# Altium footprint library domino-wire-protector.PcbLib: 120 footprints (part 5 of 8)
Each footprint in its own frame and in the unit in brackets; x right, y up, seen from the top. Pads: shape width x height; smd on the part's side, far side on the other; paste and mask are expansions set on the pad; w line width, h text height; cw(c..) or ccw(c..) is an arc to the next point about the centre after c.
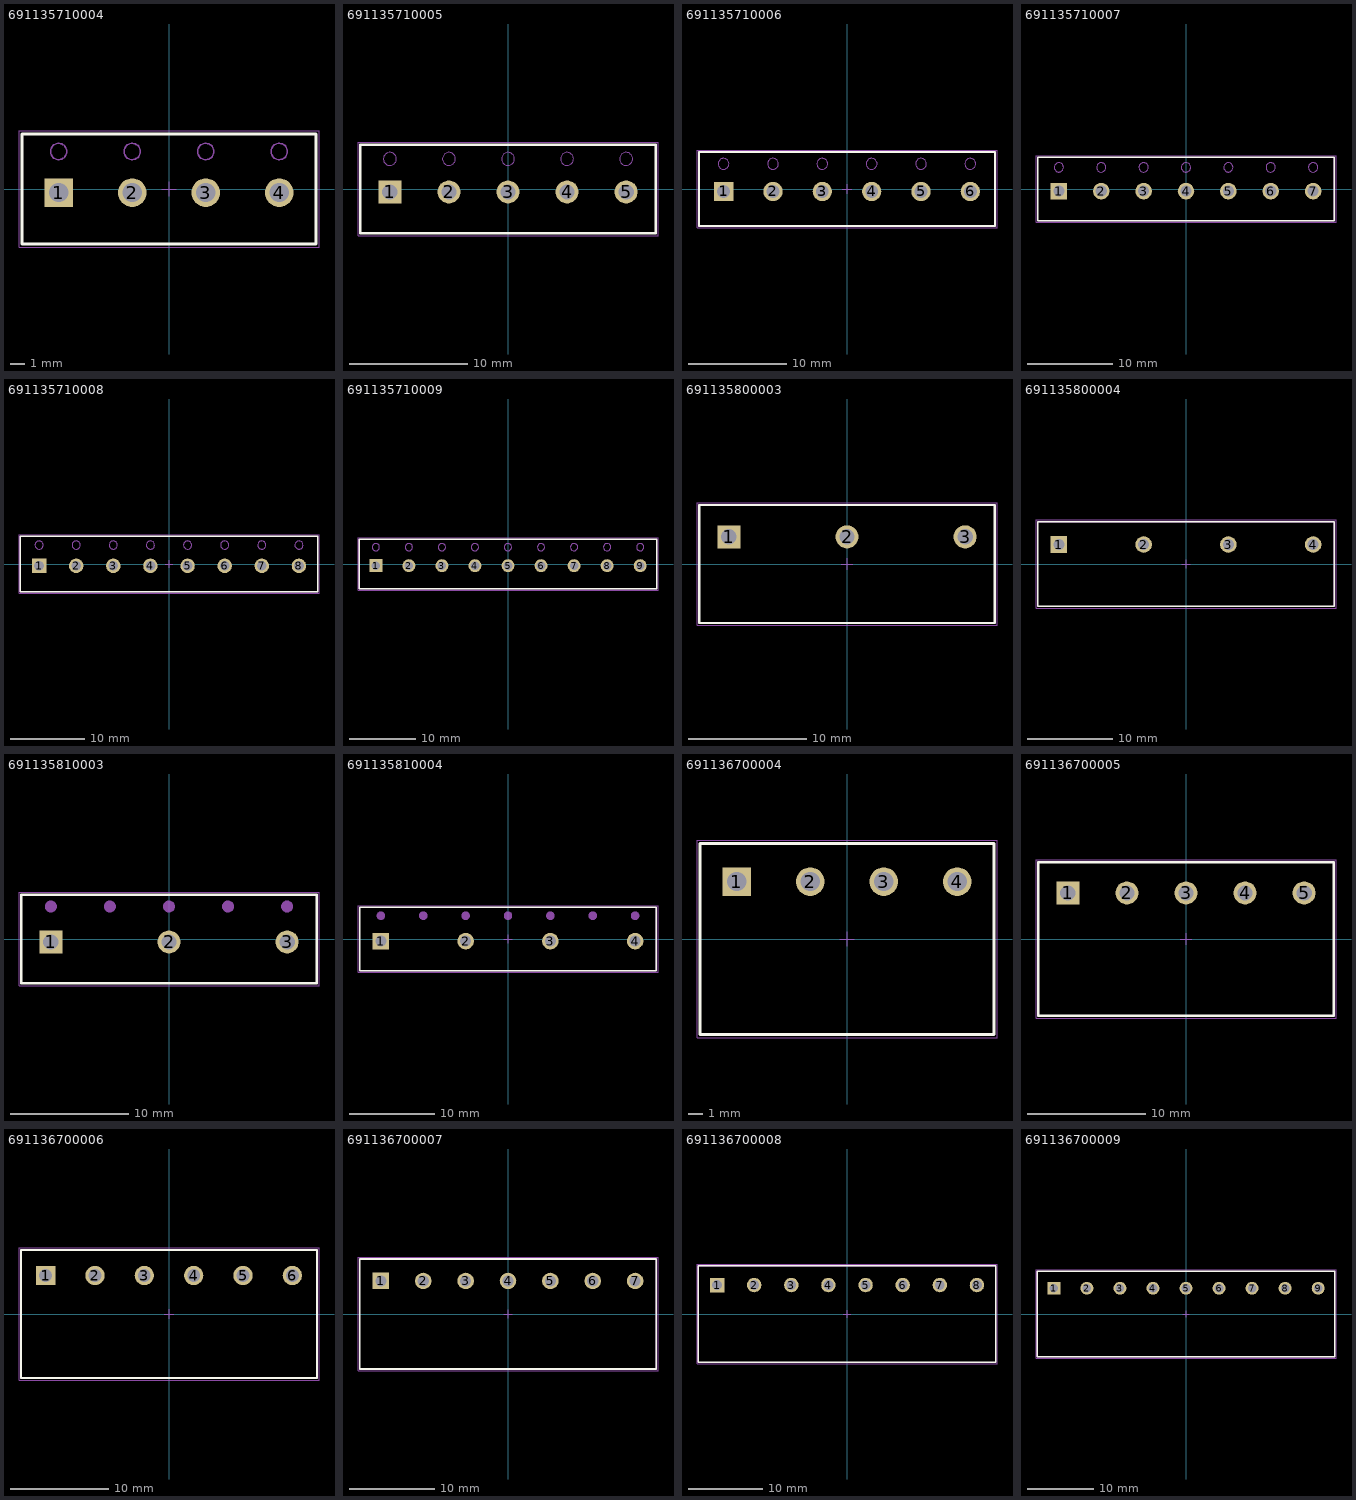
[diagram p4: the footprints below, top view; thin cyan lines are the x and y axes]

## 691135710004 [mm] "Serie 1357 - 5.00 mm_4 pins"
height 10
pads (4):
  rect 1.95x1.95 hole 1.3 paste+0: 1(-7.5,-0.25)
  round 1.95 hole 1.3 paste+0: 2(-2.5,-0.25) 3(2.5,-0.25) 4(7.5,-0.25)
Top Overlay:
  lines w0.2: -10,-3.75 10,-3.75 10,3.75 -10,3.75 -10,-3.75
Mechanical 13:
  circle w0.1: c-7.5,2.55 r0.55
  circle w0.1: c-2.5,2.55 r0.55
  circle w0.1: c2.5,2.55 r0.55
  circle w0.1: c7.5,2.55 r0.55
  lines w0.1: -10,-3.75 -10,3.75 10,3.75 10,-3.75 -10,-3.75
Mechanical 15:
  lines w0.05: -0.5,0 0.5,0 ; 0,-0.5 0,0.5 ; -10.2,-3.95 -10.2,3.95 10.2,3.95 10.2,-3.95 -10.2,-3.95
3D body "691135710004.stp": height 10.1, standoff -3.9, extent -10,-3.75 10,3.75

## 691135710005 [mm] "Serie 1357 - 5.00 mm_5 pins"
height 10
pads (5):
  rect 1.95x1.95 hole 1.3 paste+0: 1(-10,-0.25)
  round 1.95 hole 1.3 paste+0: 2(-5,-0.25) 3(0,-0.25) 4(5,-0.25) 5(10,-0.25)
Top Overlay:
  lines w0.2: -12.5,-3.75 12.5,-3.75 12.5,3.75 -12.5,3.75 -12.5,-3.75
Mechanical 13:
  circle w0.1: c-10,2.55 r0.55
  circle w0.1: c-5,2.55 r0.55
  circle w0.1: c0,2.55 r0.55
  circle w0.1: c5,2.55 r0.55
  circle w0.1: c10,2.55 r0.55
  lines w0.1: -12.5,-3.75 -12.5,3.75 12.5,3.75 12.5,-3.75 -12.5,-3.75
Mechanical 15:
  lines w0.05: -0.5,0 0.5,0 ; 0,-0.5 0,0.5 ; -12.7,-3.95 -12.7,3.95 12.7,3.95 12.7,-3.95 -12.7,-3.95
3D body "691135710005.stp": height 10.1, standoff -3.9, extent -12.5,-3.75 12.5,3.75

## 691135710006 [mm] "Serie 1357 - 5.00 mm_6 pins"
height 10
pads (6):
  rect 1.95x1.95 hole 1.3 paste+0: 1(-12.5,-0.25)
  round 1.95 hole 1.3 paste+0: 2(-7.5,-0.25) 3(-2.5,-0.25) 4(2.5,-0.25) 5(7.5,-0.25) 6(12.5,-0.25)
Top Overlay:
  lines w0.2: -15,-3.75 -15,3.75 15,3.75 15,-3.75 -15,-3.75
Mechanical 13:
  circle w0.1: c12.5,2.55 r0.55
  circle w0.1: c7.5,2.55 r0.55
  circle w0.1: c2.5,2.55 r0.55
  circle w0.1: c-2.5,2.55 r0.55
  circle w0.1: c-7.5,2.55 r0.55
  circle w0.1: c-12.5,2.55 r0.55
  lines w0.1: -15,-3.75 15,-3.75 15,3.75 -15,3.75 -15,-3.75
Mechanical 15:
  lines w0.05: -0.5,0 0.5,0 ; 0,-0.5 0,0.5 ; -15.2,-3.95 15.2,-3.95 15.2,3.95 -15.2,3.95 -15.2,-3.95
3D body "691135710006.stp": height 10.1, standoff -3.9, extent -15,-3.75 15,3.75

## 691135710007 [mm] "Serie 1357 - 5.00 mm_7 pins"
height 10
pads (7):
  rect 1.95x1.95 hole 1.3 paste+0: 1(-15,-0.25)
  round 1.95 hole 1.3 paste+0: 2(-10,-0.25) 3(-5,-0.25) 4(0,-0.25) 5(5,-0.25) 6(10,-0.25) 7(15,-0.25)
Top Overlay:
  lines w0.2: -17.5,-3.75 -17.5,3.75 17.5,3.75 17.5,-3.75 -17.5,-3.75
Mechanical 13:
  circle w0.1: c10,2.55 r0.55
  circle w0.1: c5,2.55 r0.55
  circle w0.1: c0,2.55 r0.55
  circle w0.1: c-5,2.55 r0.55
  circle w0.1: c-10,2.55 r0.55
  circle w0.1: c-15,2.55 r0.55
  circle w0.1: c15,2.55 r0.55
  lines w0.1: -17.5,-3.75 17.5,-3.75 17.5,3.75 -17.5,3.75 -17.5,-3.75
Mechanical 15:
  lines w0.05: -0.5,0 0.5,0 ; 0,-0.5 0,0.5 ; -17.7,-3.95 17.7,-3.95 17.7,3.95 -17.7,3.95 -17.7,-3.95
3D body "691135710007.stp": height 10.1, standoff -3.9, extent -17.5,-3.75 17.5,3.75

## 691135710008 [mm] "Serie 1357 - 5.00 mm_8 pins"
height 10
pads (8):
  rect 1.95x1.95 hole 1.3 paste+0: 1(-17.5,-0.25)
  round 1.95 hole 1.3 paste+0: 2(-12.5,-0.25) 3(-7.5,-0.25) 4(-2.5,-0.25) 5(2.5,-0.25) 6(7.5,-0.25) 7(12.5,-0.25) 8(17.5,-0.25)
Top Overlay:
  lines w0.2: -20,-3.75 -20,3.75 20,3.75 20,-3.75 -20,-3.75
Mechanical 13:
  circle w0.1: c7.5,2.55 r0.55
  circle w0.1: c2.5,2.55 r0.55
  circle w0.1: c-2.5,2.55 r0.55
  circle w0.1: c-7.5,2.55 r0.55
  circle w0.1: c-12.5,2.55 r0.55
  circle w0.1: c-17.5,2.55 r0.55
  circle w0.1: c12.5,2.55 r0.55
  circle w0.1: c17.5,2.55 r0.55
  lines w0.1: -20,-3.75 20,-3.75 20,3.75 -20,3.75 -20,-3.75
Mechanical 15:
  lines w0.05: -0.5,0 0.5,0 ; 0,-0.5 0,0.5 ; -20.2,-3.95 20.2,-3.95 20.2,3.95 -20.2,3.95 -20.2,-3.95
3D body "691135710008.stp": height 10.1, standoff -3.9, extent -20,-3.75 20,3.75

## 691135710009 [mm] "Serie 1357 - 5.00 mm_9 pins"
height 10
pads (9):
  rect 1.95x1.95 hole 1.3 paste+0: 1(-20,-0.25)
  round 1.95 hole 1.3 paste+0: 2(-15,-0.25) 3(-10,-0.25) 4(-5,-0.25) 5(0,-0.25) 6(5,-0.25) 7(10,-0.25) 8(15,-0.25) 9(20,-0.25)
Top Overlay:
  lines w0.2: -22.5,-3.75 22.5,-3.75 22.5,3.75 -22.5,3.75 -22.5,-3.75
Mechanical 13:
  circle w0.1: c20,2.55 r0.55
  circle w0.1: c15,2.55 r0.55
  circle w0.1: c10,2.55 r0.55
  circle w0.1: c-20,2.55 r0.55
  circle w0.1: c-15,2.55 r0.55
  circle w0.1: c-10,2.55 r0.55
  circle w0.1: c-5,2.55 r0.55
  circle w0.1: c0,2.55 r0.55
  circle w0.1: c5,2.55 r0.55
  lines w0.1: -22.5,-3.75 -22.5,3.75 22.5,3.75 22.5,-3.75 -22.5,-3.75
Mechanical 15:
  lines w0.05: -0.5,0 0.5,0 ; 0,-0.5 0,0.5 ; -22.7,-3.95 -22.7,3.95 22.7,3.95 22.7,-3.95 -22.7,-3.95
3D body "691135710009.stp": height 10.1, standoff -3.9, extent -22.5,-3.75 22.5,3.75

## 691135800003 [mm] "Verticle Cable Entry with Pressure Clamp, pitch 10mm, 03p"
height 7.5
pads (3):
  rect 1.95x1.95 hole 1.3: 1(-10,2.3)
  round 1.95 hole 1.3: 2(0,2.3) 3(10,2.3)
Top Overlay:
  lines w0.2: -12.5,-5 12.5,-5 12.5,5 -12.5,5 -12.5,-5
Mechanical 13:
  lines w0.1: -12.5,-5 -12.5,5 12.5,5 12.5,-5 -12.5,-5
Mechanical 15:
  lines w0.05: -0.5,0 0.5,0 ; 0,-0.5 0,0.5 ; -12.7,-5.2 12.7,-5.2 12.7,5.2 -12.7,5.2 -12.7,-5.2
3D body "691135800003.stp": height 7.6, standoff -3.6, extent -12.5,-5 12.5,5

## 691135800004 [mm] "Verticle Cable Entry with Pressure Clamp, pitch 10mm, 04p"
height 7.5
pads (4):
  rect 1.95x1.95 hole 1.3: 1(-15,2.3)
  round 1.95 hole 1.3: 2(-5,2.3) 3(5,2.3) 4(15,2.3)
Top Overlay:
  lines w0.2: -17.5,-5 17.5,-5 17.5,5 -17.5,5 -17.5,-5
Mechanical 13:
  lines w0.1: -17.5,-5 -17.5,5 17.5,5 17.5,-5 -17.5,-5
Mechanical 15:
  lines w0.05: -0.5,0 0.5,0 ; 0,-0.5 0,0.5 ; -17.7,-5.2 17.7,-5.2 17.7,5.2 -17.7,5.2 -17.7,-5.2
3D body "691135800004.stp": height 7.6, standoff -3.6, extent -17.5,-5 17.5,5

## 691135810003 [mm] "Horizontal Cable Entry with Pressure Clamp, pitch 10mm, 03p"
height 10
pads (3):
  rect 1.95x1.95 hole 1.3: 1(-10,-0.25)
  round 1.95 hole 1.3: 2(0,-0.25) 3(10,-0.25)
Top Overlay:
  lines w0.2: -12.5,-3.75 12.5,-3.75 12.5,3.75 -12.5,3.75 -12.5,-3.75
Mechanical 13:
  circle w0.5: c10,2.75 r0.25
  circle w0.5: c-10,2.75 r0.25
  circle w0.5: c0,2.75 r0.25
  circle w0.5: c-5,2.75 r0.25
  circle w0.5: c5,2.75 r0.25
  lines w0.1: -12.5,-3.75 -12.5,3.75 12.5,3.75 12.5,-3.75 -12.5,-3.75
Mechanical 15:
  lines w0.05: -0.5,0 0.5,0 ; 0,-0.5 0,0.5 ; -12.7,-3.95 -12.7,3.95 12.7,3.95 12.7,-3.95 -12.7,-3.95
3D body "691135810003.stp": height 10.1, standoff -3.9, extent -12.5,-3.75 12.5,3.75

## 691135810004 [mm] "Horizontal Cable Entry with Pressure Clamp, pitch 10mm, 04p"
height 10
pads (4):
  rect 1.95x1.95 hole 1.3: 1(-15,-0.25)
  round 1.95 hole 1.3: 2(-5,-0.25) 3(5,-0.25) 4(15,-0.25)
Top Overlay:
  lines w0.2: -17.5,-3.75 -17.5,3.75 17.5,3.75 17.5,-3.75 -17.5,-3.75
Mechanical 13:
  circle w0.5: c0,2.75 r0.25
  circle w0.5: c-10,2.75 r0.25
  circle w0.5: c-5,2.75 r0.25
  circle w0.5: c-15,2.75 r0.25
  circle w0.5: c5,2.75 r0.25
  circle w0.5: c10,2.75 r0.25
  circle w0.5: c15,2.75 r0.25
  lines w0.1: -17.5,-3.75 17.5,-3.75 17.5,3.75 -17.5,3.75 -17.5,-3.75
Mechanical 15:
  lines w0.05: -0.5,0 0.5,0 ; 0,-0.5 0,0.5 ; -17.7,-3.95 17.7,-3.95 17.7,3.95 -17.7,3.95 -17.7,-3.95
3D body "691135810004.stp": height 10.1, standoff -3.9, extent -17.5,-3.75 17.5,3.75

## 691136700004 [mm] "Serie 1367 - 5.00 mm _ 4 pins"
height 9
pads (4):
  rect 1.95x1.95 hole 1.3: 1(-7.5,3.9)
  round 1.95 hole 1.3: 2(-2.5,3.9) 3(2.5,3.9) 4(7.5,3.9)
Top Overlay:
  lines w0.2: -10,-6.5 -10,6.5 10,6.5 10,-6.5 -10,-6.5
Mechanical 13:
  lines w0.1: -10,-6.5 10,-6.5 10,6.5 -10,6.5 -10,-6.5
Mechanical 15:
  lines w0.05: -0.5,0 0.5,0 ; 0,-0.5 0,0.5 ; -10.2,-6.7 -10.2,6.7 10.2,6.7 10.2,-6.7 -10.2,-6.7
3D body "691136700004.stp": height 9.1, standoff -5.9, extent -10,-6.5 10,6.5

## 691136700005 [mm] "Serie 1367 - 5.00 mm _ 5 pins"
height 9
pads (5):
  rect 1.95x1.95 hole 1.3: 1(-10,3.9)
  round 1.95 hole 1.3: 2(-5,3.9) 3(0,3.9) 4(5,3.9) 5(10,3.9)
Top Overlay:
  lines w0.2: -12.5,-6.5 -12.5,6.5 12.5,6.5 12.5,-6.5 -12.5,-6.5
Mechanical 13:
  lines w0.1: -12.5,-6.5 12.5,-6.5 12.5,6.5 -12.5,6.5 -12.5,-6.5
Mechanical 15:
  lines w0.05: -0.5,0 0.5,0 ; 0,-0.5 0,0.5 ; -12.7,-6.7 -12.7,6.7 12.7,6.7 12.7,-6.7 -12.7,-6.7
3D body "691136700005.stp": height 9.1, standoff -5.9, extent -12.5,-6.5 12.5,6.5

## 691136700006 [mm] "Serie 1367 - 5.00 mm _ 6 pins"
height 9
pads (6):
  rect 1.95x1.95 hole 1.3: 1(-12.5,3.9)
  round 1.95 hole 1.3: 2(-7.5,3.9) 3(-2.5,3.9) 4(2.5,3.9) 5(7.5,3.9) 6(12.5,3.9)
Top Overlay:
  lines w0.2: -15,-6.5 15,-6.5 15,6.5 -15,6.5 -15,-6.5
Mechanical 13:
  lines w0.1: -15,-6.5 -15,6.5 15,6.5 15,-6.5 -15,-6.5
Mechanical 15:
  lines w0.05: -0.5,0 0.5,0 ; 0,-0.5 0,0.5 ; -15.2,-6.7 15.2,-6.7 15.2,6.7 -15.2,6.7 -15.2,-6.7
3D body "691136700006.stp": height 9.1, standoff -5.9, extent -15,-6.5 15,6.5

## 691136700007 [mm] "Serie 1367 - 5.00 mm _ 7 pins"
height 9
pads (7):
  rect 1.95x1.95 hole 1.3: 1(-15,3.9)
  round 1.95 hole 1.3: 2(-10,3.9) 3(-5,3.9) 4(0,3.9) 5(5,3.9) 6(10,3.9) 7(15,3.9)
Top Overlay:
  lines w0.2: -17.5,-6.5 17.5,-6.5 17.5,6.5 -17.5,6.5 -17.5,-6.5
Mechanical 13:
  lines w0.1: -17.5,-6.5 -17.5,6.5 17.5,6.5 17.5,-6.5 -17.5,-6.5
Mechanical 15:
  lines w0.05: -0.5,0 0.5,0 ; 0,-0.5 0,0.5 ; -17.7,-6.7 17.7,-6.7 17.7,6.7 -17.7,6.7 -17.7,-6.7
3D body "691136700007.stp": height 9.1, standoff -5.9, extent -17.5,-6.5 17.5,6.5

## 691136700008 [mm] "Serie 1367 - 5.00 mm _ 8 pins"
height 9
pads (8):
  rect 1.95x1.95 hole 1.3: 1(-17.5,3.9)
  round 1.95 hole 1.3: 2(-12.5,3.9) 3(-7.5,3.9) 4(-2.5,3.9) 5(2.5,3.9) 6(7.5,3.9) 7(12.5,3.9) 8(17.5,3.9)
Top Overlay:
  lines w0.2: -20,-6.5 -20,6.5 20,6.5 20,-6.5 -20,-6.5
Mechanical 13:
  lines w0.1: -20,-6.5 20,-6.5 20,6.5 -20,6.5 -20,-6.5
Mechanical 15:
  lines w0.05: -0.5,0 0.5,0 ; 0,-0.5 0,0.5 ; -20.2,-6.7 -20.2,6.7 20.2,6.7 20.2,-6.7 -20.2,-6.7
3D body "691136700008.stp": height 9.1, standoff -5.9, extent -20,-6.5 20,6.5

## 691136700009 [mm] "Serie 1367 - 5.00 mm _ 9 pins"
height 9
pads (9):
  rect 1.95x1.95 hole 1.3: 1(-20,3.9)
  round 1.95 hole 1.3: 2(-15,3.9) 3(-10,3.9) 4(-5,3.9) 5(0,3.9) 6(5,3.9) 7(10,3.9) 8(15,3.9) 9(20,3.9)
Top Overlay:
  lines w0.2: -22.5,-6.5 22.5,-6.5 22.5,6.5 -22.5,6.5 -22.5,-6.5
Mechanical 13:
  lines w0.1: -22.5,-6.5 -22.5,6.5 22.5,6.5 22.5,-6.5 -22.5,-6.5
Mechanical 15:
  lines w0.05: -0.5,0 0.5,0 ; 0,-0.5 0,0.5 ; -22.7,-6.7 22.7,-6.7 22.7,6.7 -22.7,6.7 -22.7,-6.7
3D body "691136700009.stp": height 9.1, standoff -5.9, extent -22.5,-6.5 22.5,6.5